# Altium footprint library u025Library.PcbLib: 144 footprints (part 4 of 9)
Each footprint in its own frame and in the unit in brackets; x right, y up, seen from the top. Pads: shape width x height; smd on the part's side, far side on the other; paste and mask are expansions set on the pad; w line width, h text height; cw(c..) or ccw(c..) is an arc to the next point about the centre after c.
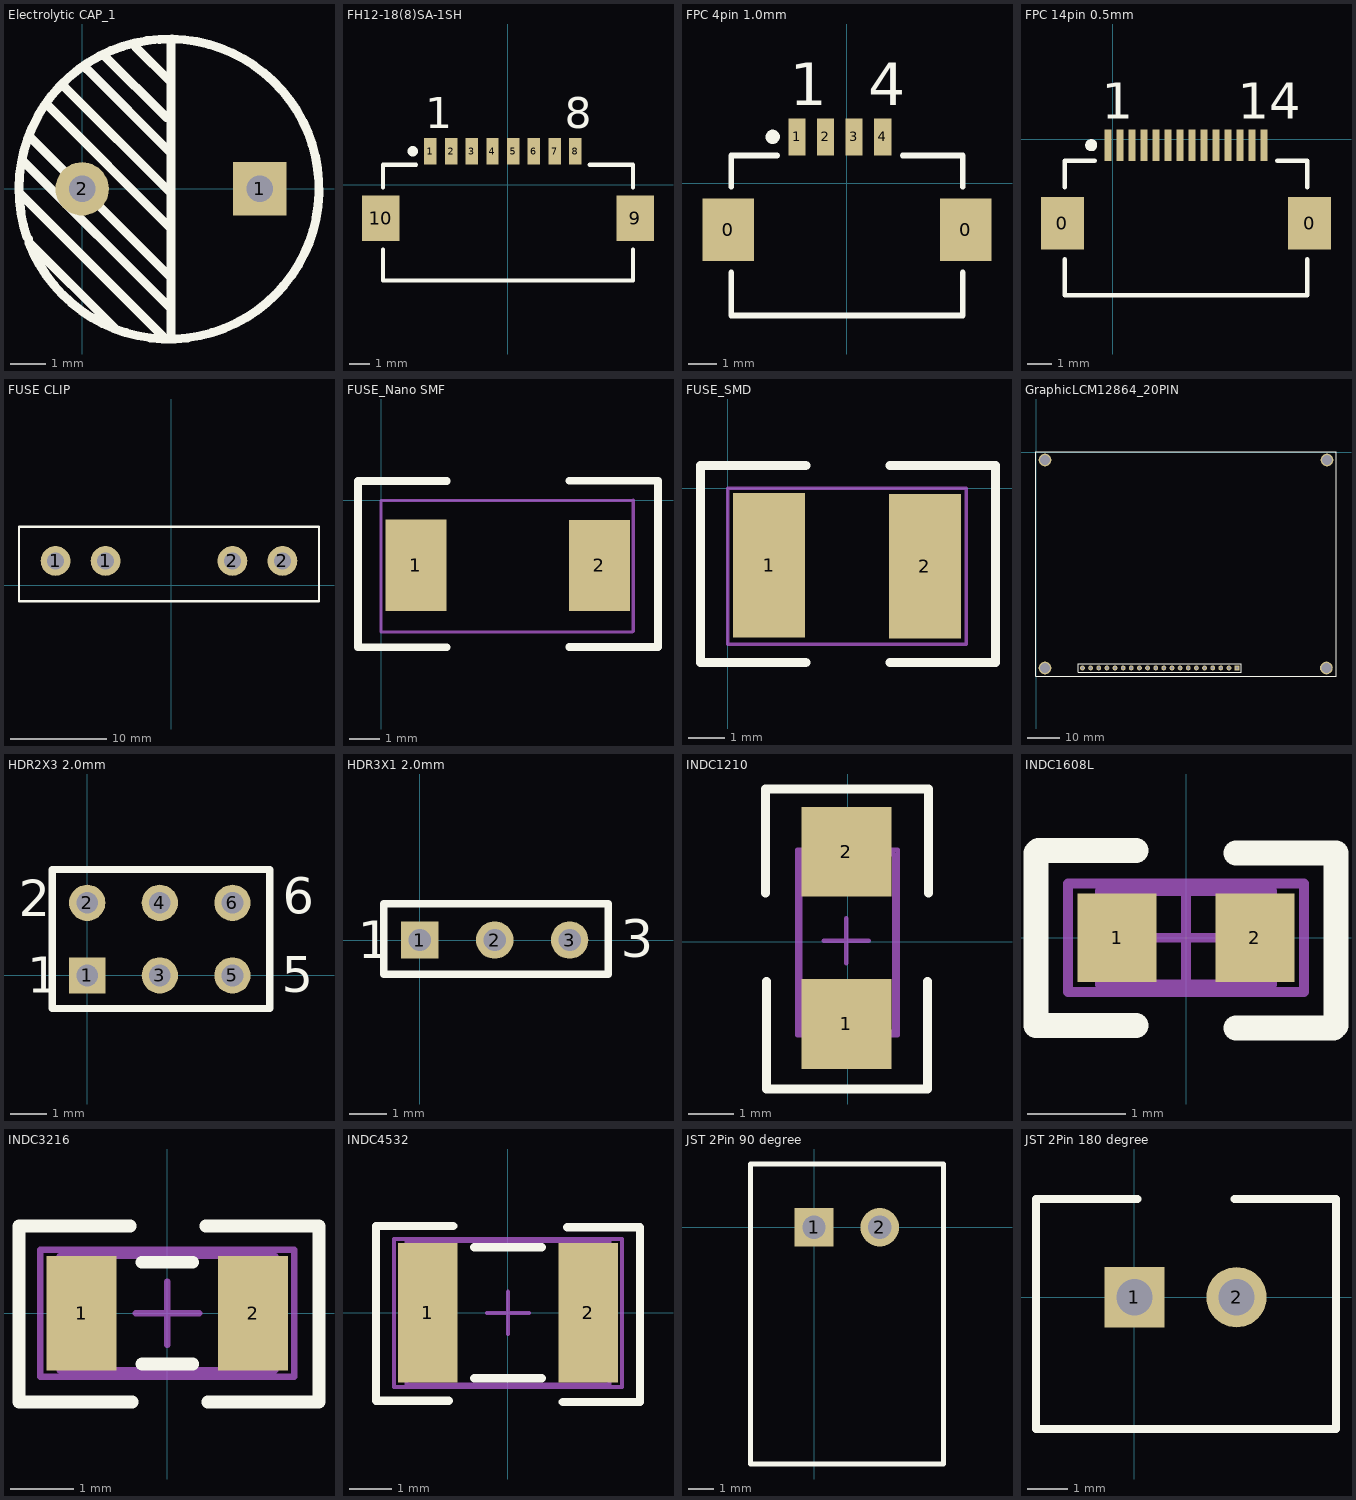
[diagram p3: the footprints below, top view; thin cyan lines are the x and y axes]

## Electrolytic CAP_1 [mil] "Electrolytic CAP_1"
pads (2):
  rect 60x60 hole 30: 1(200,0)
  round 60 hole 30: 2(0,0)
Top Overlay:
  lines w10: -70,-5 90,-165 ; -65,30 100,-135 ; -62.14,-54.03 cw(c97.74,-0.11) -60,-60 ; -60,-56.17 -60,-60 ; -60,60 100,-100 ; -40,95 100,-45 ; -25,115 -20,115 100,-5 ; 5,135 100,40 100,35 ; 25,150 95,80 ; 36.5,-156.5 -60,-60 ; 60,160 100,120 ; 100,-165 100,165 ; 100,70 100,90 ; -60,-60 -60,-60
3D body: height 1000, standoff -1131.89, extent -162,-260.84 357.69,258.84

## FH12-18(8)SA-1SH [mm] "Connector; FH12 Series; 8 Position; 1.0mm Spaced Bottom Eccentric Contact"
height 2
pads (10):
  rect 0.6x1.3 smd: 1(-3.75,1.625) 2(-2.75,1.625) 3(-1.75,1.625) 4(-0.75,1.625) 5(0.25,1.625) 6(1.25,1.625) 7(2.25,1.625) 8(3.25,1.625)
  rect 1.8x2.2 smd: 9(6.15,-1.625) 10(-6.15,-1.625)
Top Overlay:
  circle w0.25: c-4.6,1.625 r0.125
  lines w0.2: -6.05,-3.125 -6.05,-4.625 6.05,-4.625 6.05,-3.125 ; -6.05,-0.125 -6.05,0.975 -4.45,0.975 ; 3.95,0.975 6.05,0.975 6.05,-0.125
  text "8" at 2.75,2.725 h1.5
  text "1" at -4,2.725 h1.5
3D body: height 2.7, standoff -0.1, extent -7.766,-4.737 7.234,1.773

## FPC 4pin 1.0mm [mm] "Connector; FH12 Series; 4 Position; 1.0mm Spaced Bottom Eccentric Contact"
height 2
pads (6):
  rect 1.8x2.2 smd: 0(-4.15,-1.625) 0(4.15,-1.625)
  rect 0.6x1.3 smd: 1(-1.75,1.625) 2(-0.75,1.625) 3(0.25,1.625) 4(1.25,1.625)
Top Overlay:
  circle w0.25: c-2.6,1.625 r0.125
  lines w0.2: -4.05,-3.125 -4.05,-4.625 4.05,-4.625 4.05,-3.125 ; -4.05,-0.125 -4.05,0.975 -2.45,0.975 ; 1.95,0.975 4.05,0.975 4.05,-0.125
  text "4" at 0.75,2.725 h1.5
  text "1" at -2,2.725 h1.5
3D body: height 2.7, standoff -0.1, extent -5.749,-4.882 5.251,1.628

## FPC 14pin 0.5mm [mm] "Connector; FH12 Series; 14 Position; 0.5mm Spaced Bottom Eccentric Contact"
height 2
pads (16):
  rect 1.8x2.2 smd: 0(-2.091,-3.5) 0(8.209,-3.5)
  rect 0.3x1.3 smd: 1(-0.191,-0.25) 2(0.309,-0.25) 3(0.809,-0.25) 4(1.309,-0.25) 5(1.809,-0.25) 6(2.309,-0.25) 7(2.809,-0.25) 8(3.309,-0.25) 9(3.809,-0.25) 10(4.309,-0.25) 11(4.809,-0.25) 12(5.309,-0.25) 13(5.809,-0.25) 14(6.309,-0.25)
Top Overlay:
  circle w0.25: c-0.891,-0.25 r0.125
  lines w0.2: -1.991,-5 -1.991,-6.5 8.109,-6.5 8.109,-5 ; -1.991,-2 -1.991,-0.9 -0.741,-0.9 ; 6.859,-0.9 8.109,-0.9 8.109,-2
  text "1" at -0.441,0.85 h1.5
  text "14" at 5.209,0.85 h1.5
3D body: height 2.2, standoff -0.05, extent -2.534,-6.313 8.566,0.186

## FUSE CLIP [mm]
pads (4):
  round 3.1 hole 1.8: 1(-12.065,2.54) 1(-6.858,2.54) 2(6.35,2.54) 2(11.557,2.54)
Top Overlay:
  lines w0.254: -15.875,-1.651 15.367,-1.651 15.367,6.096 -15.875,6.096 -15.875,-1.524
3D body: height 4.6, standoff -0.4, extent -10.791,0.512 9.209,5.512

## FUSE_Nano SMF [mm] "FUSE Nano SMF"
pads (2):
  rect 2x3 smd: 1(1.143,-2.134) 2(7.169,-2.135)
Top Overlay:
  lines w0.254: 2.159,-4.826 -0.762,-4.826 -0.762,0.635 2.159,0.635 ; 6.176,-4.813 9.097,-4.813 9.097,0.648 6.176,0.648
Mechanical 15:
  lines w0.1: 8.263,-4.318 0,-4.318 0,0 8.284,0 ; 8.284,-4.305 8.284,0.013
3D body: height 2.7, standoff 0, extent 1.057,-3.484 7.157,-0.784

## FUSE_SMD [mm] "FUSE_SMD"
pads (2):
  rect 2x4 smd: 1(1.143,-2.134) 2(5.461,-2.159)
Top Overlay:
  lines w0.254: 2.159,-4.826 -0.762,-4.826 -0.762,0.635 2.159,0.635 ; 4.496,-4.826 7.417,-4.826 7.417,0.635 4.496,0.635
Mechanical 15:
  lines w0.1: 0,-4.318 6.604,-4.318 6.604,0 0,0 0,-4.318
3D body: height 1.03, standoff 0, extent 0.881,-3.899 5.616,-0.419

## GraphicLCM12864_20PIN [mm] "GraphicLCM12864_20PIN_15mm"
height 20
pads (24):
  rect 1.5x1.5 hole 0.9: 1(62.726,-67.386)
  round 1.5 hole 0.9: 2(60.186,-67.386) 3(57.646,-67.386) 4(55.106,-67.386) 5(52.566,-67.386) 6(50.026,-67.386) 7(47.486,-67.386) 8(44.946,-67.386) 9(42.406,-67.386) 10(39.866,-67.386) 11(37.326,-67.386) 12(34.786,-67.386) 13(32.246,-67.386) 14(29.706,-67.386) 15(27.166,-67.386) 16(24.626,-67.386) 17(22.086,-67.386) 18(19.546,-67.386) 19(17.006,-67.386) 20(14.466,-67.386)
  round 4 hole 3.2: ""(2.766,-67.386) ""(2.766,-2.474) ""(90.587,-67.386) ""(90.787,-2.474)
Top Overlay:
  lines w0.2: 13.196,-68.656 62.091,-68.656 63.996,-68.656 63.996,-66.116 13.196,-66.116 13.196,-68.656
  lines w0.254: -0.034,-69.9 93.587,-69.9 93.587,0.026 -0.034,0.026 -0.034,-69.9
3D body: height -7, standoff -20.6, extent 0.598,-69.977 93.598,0.023

## HDR2X3 2.0mm [mm] "Connector; Header; 3x2 Position 2.0mm"
pads (6):
  rect 1x1 hole 0.6: 1(0,0)
  round 1 hole 0.6: 2(0,2) 3(2,0) 4(2,2) 5(4,0) 6(4,2)
Top Overlay:
  lines w0.2: -0.965,-0.914 5.029,-0.914 5.029,2.921 -0.965,2.921 -0.965,-0.914
  text "1" at -1.651,-0.483 h1
  text "2" at -1.88,1.626 h1
  text "5" at 5.359,-0.457 h1
  text "6" at 5.385,1.702 h1

## HDR3X1 2.0mm [mm] "Connector; Header; 31 Position 2.0mm"
pads (3):
  rect 1x1 hole 0.6: 1(0,0)
  round 1 hole 0.6: 2(2,0) 3(4,0)
Top Overlay:
  lines w0.2: -0.965,-0.914 5.029,-0.914 5.029,0.968 -0.965,0.968 -0.965,-0.914
  text "1" at -1.651,-0.483 h1
  text "3" at 5.359,-0.457 h1

## INDC1210 [mm] "Chip Inductor, Body 3.2mm x 2.5mm, IPC High Density"
height 2
pads (2):
  rect 2x2 smd: 1(-0.025,-1.829) 2(-0.025,2.007)
Top Overlay:
  lines w0.2: -1.829,1.086 -1.829,3.404 1.803,3.404 1.803,1.086 ; -1.803,-0.883 -1.803,-3.277 1.778,-3.277 1.778,-0.883
Mechanical 13:
  lines w0.1: -1.052,-2.007 1.041,-2.007 1.041,1.956 -1.052,1.956 -1.052,-2.007
Mechanical 15:
  lines w0.1: -0.525,0.025 0.475,0.025 ; -0.025,-0.475 -0.025,0.525 ; -1.118,-2.083 1.118,-2.083 1.118,2.051 -1.118,2.051 -1.118,-2.083
3D body: height 3.2, standoff 0, extent -1.6,-2.098 1.6,2.402

## INDC1608L [mm] "Chip Inductor, Body 1.6x0.8mm, IPC High Density"
height 0.55
pads (2):
  rect 0.8x0.9 smd: 1(-0.7,0) 2(0.7,0)
Top Overlay:
  lines w0.254: -0.508,-0.889 -1.524,-0.889 -1.524,0.864 -1.499,0.889 -0.508,0.889 ; 0.508,-0.914 1.499,-0.914 ; 0.508,0.864 1.524,0.864 1.524,-0.889
Mechanical 13:
  lines w0.1: -0.875,-0.475 0.875,-0.475 0.875,0.475 -0.875,0.475 -0.875,-0.475
Mechanical 15:
  lines w0.1: -0.475,0 0.475,0 ; 0,-0.475 0,0.475 ; -1.2,-0.55 1.2,-0.55 1.2,0.55 -1.2,0.55 -1.2,-0.55
3D body: height 0.4, standoff -0.4, extent -0.8,-0.467 0.8,0.483

## INDC3216 [mm] "Chip Inductor, Body 3.2x1.6mm, IPC High Density"
height 0.55
pads (2):
  rect 1.1x1.8 smd: 1(-1.35,0) 2(1.35,0)
Top Overlay:
  lines w0.2: -0.584,1.372 -2.337,1.372 -2.337,-1.397 -0.552,-1.397 ; -0.4,-0.8 0.4,-0.8 ; -0.4,0.8 0.4,0.8 ; 0.603,1.372 2.388,1.372 2.388,-1.397 0.635,-1.397
Mechanical 13:
  lines w0.1: -1.7,-0.9 1.7,-0.9 1.7,0.9 -1.7,0.9 -1.7,-0.9
Mechanical 15:
  lines w0.1: -0.5,0 0.5,0 ; 0,-0.5 0,0.5 ; -2,-1 2,-1 2,1 -2,1 -2,-1
3D body: height 1.25, standoff -1.25, extent -1.498,-0.766 1.702,0.584

## INDC4532 [mm] "Chip Inductor, Body 4.5x3.2mm, IPC High Density"
height 0.55
pads (2):
  rect 1.4x3.3 smd: 1(-1.9,0) 2(1.9,0)
Top Overlay:
  lines w0.2: -1.397,-2.083 -3.124,-2.083 -3.124,2.057 -1.295,2.057 ; -0.8,-1.55 0.8,-1.55 ; -0.8,1.55 0.8,1.55 ; 1.295,-2.108 3.124,-2.108 3.124,2.032 1.397,2.032
Mechanical 13:
  lines w0.1: -2.4,-1.7 2.4,-1.7 2.4,1.7 -2.4,1.7 -2.4,-1.7
Mechanical 15:
  lines w0.1: -0.5,0 0.5,0 ; 0,-0.5 0,0.5 ; -2.7,-1.75 2.7,-1.75 2.7,1.75 -2.7,1.75 -2.7,-1.75
3D body: height 1.75, standoff 0, extent -2.148,-1.575 2.352,1.625

## JST 2Pin 90 degree [mm] "Connector; JST; 2 Position 90"
pads (2):
  rect 1.5x1.5 hole 0.9: 1(0,0)
  round 1.5 hole 0.9: 2(2.54,0)
Top Overlay:
  lines w0.2: 4.978,2.443 -2.45,2.443 -2.45,-9.151 4.996,-9.151 4.996,2.443
3D body: height 6.1, standoff -2, extent -2.442,-9.141 4.958,2.359

## JST 2Pin 180 degree [mm] "Connector; JST; 2 Position 180"
pads (2):
  rect 1.5x1.5 hole 0.9: 1(0,0)
  round 1.5 hole 0.9: 2(2.54,0)
Top Overlay:
  lines w0.2: 0.074,2.443 -2.45,2.443 -2.45,-3.28 5.013,-3.28 5.013,2.443 2.489,2.443
3D body: height 7, standoff -3.4, extent -2.384,-3.409 5.016,2.341